# Altium footprint library Arduino.PcbLib: 3 footprints
Each footprint in its own frame and in the unit in brackets; x right, y up, seen from the top. Pads: shape width x height; smd on the part's side, far side on the other; paste and mask are expansions set on the pad; w line width, h text height; cw(c..) or ccw(c..) is an arc to the next point about the centre after c.
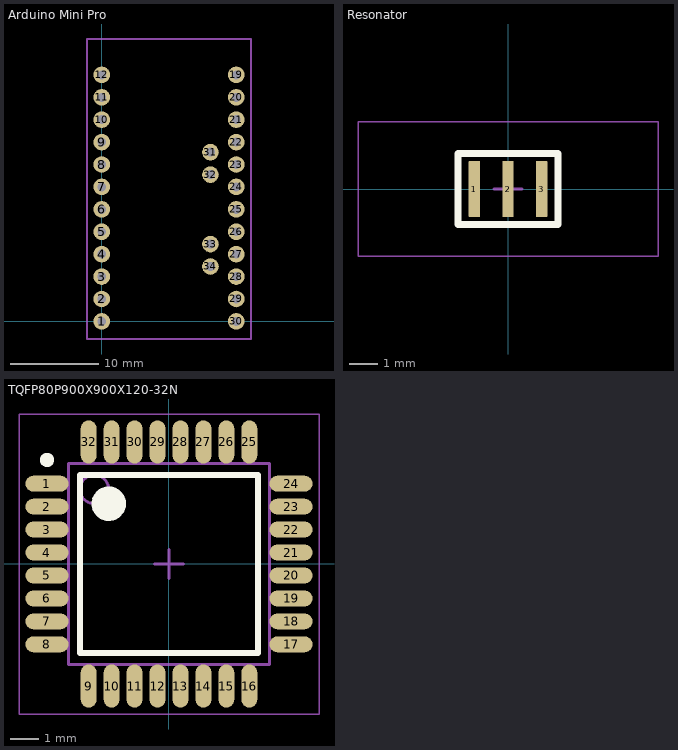
[diagram p0: the footprints below, top view; thin cyan lines are the x and y axes]

## Arduino Mini Pro [mil]
pads (28):
  round 74 hole 40: 1(0,0) 2(0,100) 3(0,200) 4(0,300) 5(0,400) 6(0,500) 7(0,600) 8(0,700) 9(0,800) 10(0,900) 11(0,1000) 12(0,1100) 19(600,1100) 20(600,1000) 21(600,900) 22(600,800) 23(600,700) 24(600,600) 25(600,500) 26(600,400) 27(600,300) 28(600,200) 29(600,100) 30(600,0) 31(485,755) 32(485,655) 33(485,345) 34(485,245)
Mechanical 13:
  lines w10: -66.14,-78.58 -66.14,1260 666.14,1260 666.14,-78.58 -66.14,-78.58
3D body "ARDUINO_MINI_V2b.STEP": height 237.64, standoff -0.55, extent -66.14,-78.58 666.14,1260

## Resonator [mm] "Ceramic Resonator"
height 0.7
pads (3):
  rrect10% 0.4x2 smd: 1(-1.2,0) 2(0,0) 3(1.2,0)
Top Overlay:
  lines w0.254: -1.778,-1.27 -1.778,1.27 0,1.27 1.778,1.27 1.778,-1.27 0,-1.27 -1.778,-1.27
Mechanical 13:
  lines w0.1: -1.778,-1.27 0,-1.27 1.778,-1.27 1.778,1.27 0,1.27 -1.778,1.27 -1.778,-1.27
  text ".Comment" at -2.225,-0.55 h0.51
  text ".Designator" at -2.25,0.15 h0.51
Mechanical 15:
  lines w0.05: -5.35,-2.4 -5.35,2.4 5.35,2.4 5.35,-2.4 -5.35,-2.4
  lines w0.1: -0.5,0 0.5,0 ; 0,-0.5 0,0.5
3D body "CSTCE.STEP": height 0.7, standoff 0, extent -1.6,-0.65 1.6,0.65

## TQFP80P900X900X120-32N [mm] "TQFP, 32-Leads, Body 7,00x7,00mm, Pitch 0,80mm, IPC Medium Density"
height 1.2
pads (32):
  oval 1.5x0.55 smd: 1(-4.25,2.8) 2(-4.25,2) 3(-4.25,1.2) 4(-4.25,0.4) 5(-4.25,-0.4) 6(-4.25,-1.2) 7(-4.25,-2) 8(-4.25,-2.8) 17(4.25,-2.8) 18(4.25,-2) 19(4.25,-1.2) 20(4.25,-0.4) 21(4.25,0.4) 22(4.25,1.2) 23(4.25,2) 24(4.25,2.8)
  oval 0.55x1.5 smd: 9(-2.8,-4.25) 10(-2,-4.25) 11(-1.2,-4.25) 12(-0.4,-4.25) 13(0.4,-4.25) 14(1.2,-4.25) 15(2,-4.25) 16(2.8,-4.25) 25(2.8,4.25) 26(2,4.25) 27(1.2,4.25) 28(0.4,4.25) 29(-0.4,4.25) 30(-1.2,4.25) 31(-2,4.25) 32(-2.8,4.25)
Top Overlay:
  circle w0.6: c-2.1,2.1 r0.3
  circle w0.25: c-4.25,3.625 r0.125
  lines w0.2: -3.1,-3.1 3.1,-3.1 3.1,3.1 -3.1,3.1 -3.1,-3.1
Mechanical 13:
  circle w0.1: c-2.6,2.6 r0.5
  lines w0.1: -3.5,-3.5 3.5,-3.5 3.5,3.5 -3.5,3.5 -3.5,-3.5
  text ".Designator" at -2.352,0.175 h0.51
  text ".Comment" at -2.327,-0.525 h0.51
Mechanical 15:
  lines w0.05: -5.225,-5.225 5.225,-5.225 5.225,5.225 -5.225,5.225 -5.225,-5.225
  lines w0.1: -0.5,0 0.5,0 ; 0,-0.5 0,0.5
3D body "TQFP80P900X900X120-32N.step": height 1.2, standoff 0, extent -4.5,-4.5 4.5,4.5